# Altium schematic symbol library Minh_Lib.SchLib: 619 symbols (part 1 of 4) (continued)
## C1206C103J4RACTU
designator C?  Supplier Part Number 1: 80-C1206C103J4R
Capacitor, ceramic, 10Nf, 16Vdc, 5-% Tol, 5+% Tol, x7R-Tc Code, -15, 15%-Tc Rohs Compliant: Yes; Manufacturer: KEMET; Manufacturer Part Number: C1206C103J4RACTU; Tolerance: 5%; Dielectric: X7R; Voltage Rating (DC): 16V; Supplier 1: Mouser; RoHS: Yes; Category: Ceramic Capacitors; Stock 1: 1310; Pricing 1: 1=0.48000, 10=0.32300, 50=0.32300, 100=0.19400, 1000=0.13700, 10000=0.11000 (USD); Mount: Surface Mount; Case/Package: 1206; Dielectric Material: Ceramic; Case Code (Imperial): 1206; Case Code (Metric): 3216; Weight: 0.000571oz; Min Operating Temperature: -55°C; Max Operating Temperature: 125°C; Capacitance: 10nF; Packaging: Tape and Reel; Voltage Rating: 16V; Construction: Flat; Package Quantity: 4000; Termination: SMD/SMT; Series: C1206C; Length: 3.2mm; Width: 1.6mm; Height: 0.78mm; Depth: 1.6mm; Thickness: 0.035inch; RoHS Compliant: Yes; ComponentLink1URL: http://www.mouser.com/ds/2/212/KEM_C1002_X7R_SMD-1102033.pdf?src-supplier=Mouser; ComponentLink1Description: http://www.mouser.com/ds/2/212/KEM_C1002_X7R_SMD-1102033.pdf?src-supplier=Mouser; ComponentLink2URL: http://components.arrow.com/part/dataview/3455918S8615911N7429?src-supplier=Arrow+Electronics; ComponentLink2Description: http://components.arrow.com/part/dataview/3455918S8615911N7429?src-supplier=Arrow+Electronics; ComponentLink3URL: https://search.kemet.com/component-edge/download/datasheet/C1206C103J4RACTU.pdf?src-supplier=Digi-Key; ComponentLink3Description: https://search.kemet.com/component-edge/download/datasheet/C1206C103J4RACTU.pdf?src-supplier=Digi-Key
footprint CAP1206
pins: 1, 2

## C1206C103J5RACTU
designator C?  Supplier Part Number 1: 27X7669
1206 C 10nF Ceramic Multilayer Capacitor; 50 VDC; +125degC; X7R Dielec; +/-5%; Manufacturer: KEMET; Manufacturer Part Number: C1206C103J5RACTU; Tolerance: 5%; Voltage Rating (DC): 50V; Dissipation Factor: 2.5%; Supplier 1: Newark; RoHS: Yes; Category: Ceramic Capacitors; Stock 1: 8000; Pricing 1: 1=0.02100, 8000=0.02100, 16000=0.02100, 24000=0.02100 (USD); Mount: Surface Mount,PCB; Case/Package: 1206; Case Code (Imperial): 1206; Case Code (Metric): 3216; Dielectric Material: Ceramic; Contact Plating: Tin,Matte; Min Operating Temperature: -55°C; Max Operating Temperature: 125°C; Capacitance: 10nF; Packaging: Tape and Reel; Dielectric: X7R; Voltage Rating: 50V; Package Quantity: 1; Termination: SMD/SMT; Series: C; Construction: Flat; Voltage: 50V; Length: 3.2mm; Width: 1.6mm; Height: 0.78mm; Depth: 1.6mm; Thickness: 0.035inch; Radiation Hardening: No; RoHS Compliant: Yes; REACH SVHC: No SVHC; ComponentLink1URL: https://datasheet.ciiva.com/7730/kem-c1002-x7r-smd-7730069.pdf?src-supplier=Element14; ComponentLink1Description: https://datasheet.ciiva.com/7730/kem-c1002-x7r-smd-7730069.pdf?src-supplier=Element14; ComponentLink2URL: https://datasheet.ciiva.com/18194/getdatasheetpartid-385816-18194103.pdf?src-supplier=Verical; ComponentLink2Description: https://datasheet.ciiva.com/18194/getdatasheetpartid-385816-18194103.pdf?src-supplier=Verical; ComponentLink3URL: https://datasheet.ciiva.com/46392/1791936-46392364.pdf?src-supplier=Element14; ComponentLink3Description: https://datasheet.ciiva.com/46392/1791936-46392364.pdf?src-supplier=Element14
footprint CAP1206
pins: 1, 2

## C1206C103J8GACTU
designator C?  Supplier Part Number 1: 80-C1206C103J8G
Multilayer Ceramic Capacitors MLCC - SMD/SMT 10volts 10000pF C0G 5%; Manufacturer: KEMET; Manufacturer Part Number: C1206C103J8GACTU; Capacitance: 10nF; Voltage Rating: 10V; Dissipation Factor: 0.1%; Supplier 1: Mouser; RoHS: Yes; Category: Ceramic Capacitors; Case/Package: 1206; Case Code (Imperial): 1206; Case Code (Metric): 3216; Min Operating Temperature: -55°C; Max Operating Temperature: 125°C; Tolerance: 5%; Packaging: Tape and Reel; Package Quantity: 4000; Voltage Rating (DC): 10V; Dielectric: C0G; Termination: SMD/SMT; Series: C1206C; Length: 3.2mm; Width: 1.6mm; Height: 1mm; RoHS Compliant: Yes; ComponentLink1URL: https://datasheet.ciiva.com/13270/kem-c1003-c0g-smd-356956-13270396.pdf?src-supplier=Mouser; ComponentLink1Description: https://datasheet.ciiva.com/13270/kem-c1003-c0g-smd-356956-13270396.pdf?src-supplier=Mouser
footprint CAP1206
pins: 1, 2

## C1206C103K3HACTU
designator C?  Supplier Part Number 1: 80-C1206C103K3H
Cap Ceramic 0.01uF 25V X8R 10% SMD 1206 150Â°C T/R; Manufacturer: KEMET; Manufacturer Part Number: C1206C103K3HACTU; Capacitance: 10nF; Dissipation Factor: 2.5%; Supplier 1: Mouser; RoHS: Yes; Category: Ceramic Capacitors; Case/Package: 1206; Case Code (Imperial): 1206; Case Code (Metric): 3216; Min Operating Temperature: -55°C; Max Operating Temperature: 150°C; Tolerance: 10%; Dielectric: X8R; Packaging: Tape and Reel; Voltage Rating (DC): 25V; Voltage Rating: 25V; Package Quantity: 4000; Termination: SMD/SMT; Series: C1206C; Length: 3.2mm; Width: 1.6mm; Height: 0.78mm; RoHS Compliant: Yes; ComponentLink1URL: http://www.mouser.com/ds/2/212/KEM_C1007_X8R_ULTRA_150C_SMD-355490.pdf?src-supplier=Mouser; ComponentLink1Description: http://www.mouser.com/ds/2/212/KEM_C1007_X8R_ULTRA_150C_SMD-355490.pdf?src-supplier=Mouser
footprint CAP1206
pins: 1, 2

## C1206C103K4RACTU
designator C?  Supplier Part Number 1: 82AC2532
Cap Ceramic 0.01uF 16V X7R 10% SMD 1206 125°C Plastic T/R; Manufacturer: KEMET; Manufacturer Part Number: C1206C103K4RACTU; Capacitance: 10nF; Supplier 1: Newark; RoHS: Yes; Category: Ceramic Capacitors; Stock 1: 3050; Pricing 1: 10=0.29000, 25=0.24900, 50=0.20600, 100=0.16500 (USD); Mount: Surface Mount; Case/Package: 1206; Dielectric Material: Ceramic; Case Code (Imperial): 1206; Case Code (Metric): 3216; Weight: 0.000571oz; Min Operating Temperature: -55°C; Max Operating Temperature: 125°C; Tolerance: 10%; Voltage Rating (DC): 16V; Dielectric: X7R; Packaging: Tape and Reel; Voltage Rating: 16V; Package Quantity: 4000; Termination: SMD/SMT; Series: C; Construction: Flat; Length: 3.2mm; Width: 1.6mm; Height: 0.78mm; Depth: 1.6mm; Thickness: 0.035inch; RoHS Compliant: Yes; ComponentLink1URL: http://components.arrow.com/part/dataview/3455975S8615920N7429?src-supplier=Arrow+Electronics; ComponentLink1Description: http://components.arrow.com/part/dataview/3455975S8615920N7429?src-supplier=Arrow+Electronics; ComponentLink2URL: http://www.mouser.com/ds/2/212/KEM_C1002_X7R_SMD-1102033.pdf?src-supplier=Mouser; ComponentLink2Description: http://www.mouser.com/ds/2/212/KEM_C1002_X7R_SMD-1102033.pdf?src-supplier=Mouser; ComponentLink3URL: http://www.kemet.com/docfinder?Partnumber=C1206C103K4RACTU&src-supplier=Digi-Key; ComponentLink3Description: http://www.kemet.com/docfinder?Partnumber=C1206C103K4RACTU&src-supplier=Digi-Key
footprint CAP1206
pins: 1, 2

## C1206C103K5RAC
designator C?  Supplier Part Number 1: C1206C103K5RAC
Cap Ceramic 0.01uF 50V X7R 10% Pad SMD 1206 125C Bulk; Manufacturer: KEMET; Capacitance: 10nF; Dissipation Factor: 2.5%; Supplier 1: Arrow Electronics; Manufacturer Part Number: C1206C103K5RAC; RoHS: Yes; Category: Ceramic Capacitors; Stock 1: 28636; Pricing 1: 1=0.20000, 10=0.07820, 100=0.05390, 500=0.04460, 1000=0.03550, 4000=0.02750, 8000=0.02440, 24000=0.02230, 48000=0.01840 (USD); Mount: Surface Mount; Case/Package: 1206; Number of Pins: 2; Case Code (Imperial): 1206; Case Code (Metric): 3216; Dielectric Material: Ceramic; Material: Ceramic; Min Operating Temperature: -55°C; Max Operating Temperature: 125°C; Tolerance: 10%; Packaging: Tape and Reel; Package Quantity: 4000; Voltage Rating (DC): 50V; Dielectric: X7R; Termination: SMD/SMT; Series: C1206C; Voltage Rating: 50V; Voltage: 50V; Length: 3.2mm; Width: 1.6mm; Height: 0.78mm; Depth: 1.6mm; ComponentLink1URL: https://datasheet.ciiva.com/14116/slceramic-chip-condensers-e-14116570.pdf?src-supplier=Distrelec; ComponentLink1Description: https://datasheet.ciiva.com/14116/slceramic-chip-condensers-e-14116570.pdf?src-supplier=Distrelec; ComponentLink2URL: https://datasheet.ciiva.com/13389/kem-c1002-x7r-smd-357932-13389673.pdf?src-supplier=Mouser; ComponentLink2Description: https://datasheet.ciiva.com/13389/kem-c1002-x7r-smd-357932-13389673.pdf?src-supplier=Mouser; ComponentLink3URL: https://datasheet.ciiva.com/29242/458111-da-01-en-keramik-kondensator-c1206c103k5rac-29242412.pdf?src-supplier=Conrad; ComponentLink3Description: https://datasheet.ciiva.com/29242/458111-da-01-en-keramik-kondensator-c1206c103k5rac-29242412.pdf?src-supplier=Conrad
footprint CAP1206
pins: 1, 2

## C1206C103K8JACAUTO
designator C?  Supplier Part Number 1: 71111625
Cap Cer 10000PF 10V U2J 1206 10%; Manufacturer: KEMET; Manufacturer Part Number: C1206C103K8JACAUTO; Supplier 1: Allied Electronics; RoHS: Yes; Category: Ceramic Capacitors; Pricing 1: 4000=0.09300, 200000=0.09100 (USD); RoHS Compliant: Yes
footprint CAP1206
pins: 1, 2

## C1206C104J3GACTU
designator C?  Supplier Part Number 1: 8029970
1206 C 100nF Ceramic Multilayer Capacitor; 25 V; +125degC; C0G Dielectric; +/-5%; Manufacturer: KEMET; Manufacturer Part Number: C1206C104J3GACTU; Tolerance: 5%; Voltage Rating (DC): 25V; Dissipation Factor: 0.1%; Temperature Coefficient: 30ppm/°C; Supplier 1: RSComponents; RoHS: Yes; Category: Ceramic Capacitors; Stock 1: 155; Pricing 1: 5=1.92300, 250=0.92500, 1000=0.77200, 2000=0.52200 (USD); Mount: Surface Mount,PCB; Case/Package: 1206; Number of Pins: 2; Dielectric Material: Ceramic; Case Code (Metric): 3216; Case Code (Imperial): 1206; Contact Plating: Tin,Matte; Min Operating Temperature: -55°C; Max Operating Temperature: 125°C; Capacitance: 100nF; Dielectric: C0G; Packaging: Tape and Reel; Voltage Rating: 25V; Package Quantity: 2000; Series: -; Termination: SMD/SMT; Construction: Flat; Voltage: 25V; Length: 3.2mm; Width: 0.063inch; Height: 1.6mm; Depth: 1.6mm; Thickness: 0.071inch; Radiation Hardening: No; RoHS Compliant: Yes; Lead Free: Lead Free; REACH SVHC: No SVHC; ComponentLink1URL: https://datasheet.ciiva.com/7729/96329-7729797.pdf?src-supplier=Element14; ComponentLink1Description: https://datasheet.ciiva.com/7729/96329-7729797.pdf?src-supplier=Element14; ComponentLink2URL: https://datasheet.ciiva.com/5427/kem-c1003-c0g-smd-356956-5427960.pdf?src-supplier=Mouser; ComponentLink2Description: https://datasheet.ciiva.com/5427/kem-c1003-c0g-smd-356956-5427960.pdf?src-supplier=Mouser; ComponentLink3URL: https://datasheet.ciiva.com/6094/f9080b-0402-series-c0g-6094136.pdf?src-supplier=Farnell; ComponentLink3Description: https://datasheet.ciiva.com/6094/f9080b-0402-series-c0g-6094136.pdf?src-supplier=Farnell; ComponentLink4URL: https://datasheet.ciiva.com/28533/1372242-28533225.pdf?src-supplier=Element14; ComponentLink4Description: https://datasheet.ciiva.com/28533/1372242-28533225.pdf?src-supplier=Element14; ComponentLink5URL: https://datasheet.ciiva.com/7730/f9080b-0402-series-c0g-7730074.pdf?src-supplier=Element14; ComponentLink5Description: https://datasheet.ciiva.com/7730/f9080b-0402-series-c0g-7730074.pdf?src-supplier=Element14
footprint CAP1206
pins: 1, 2

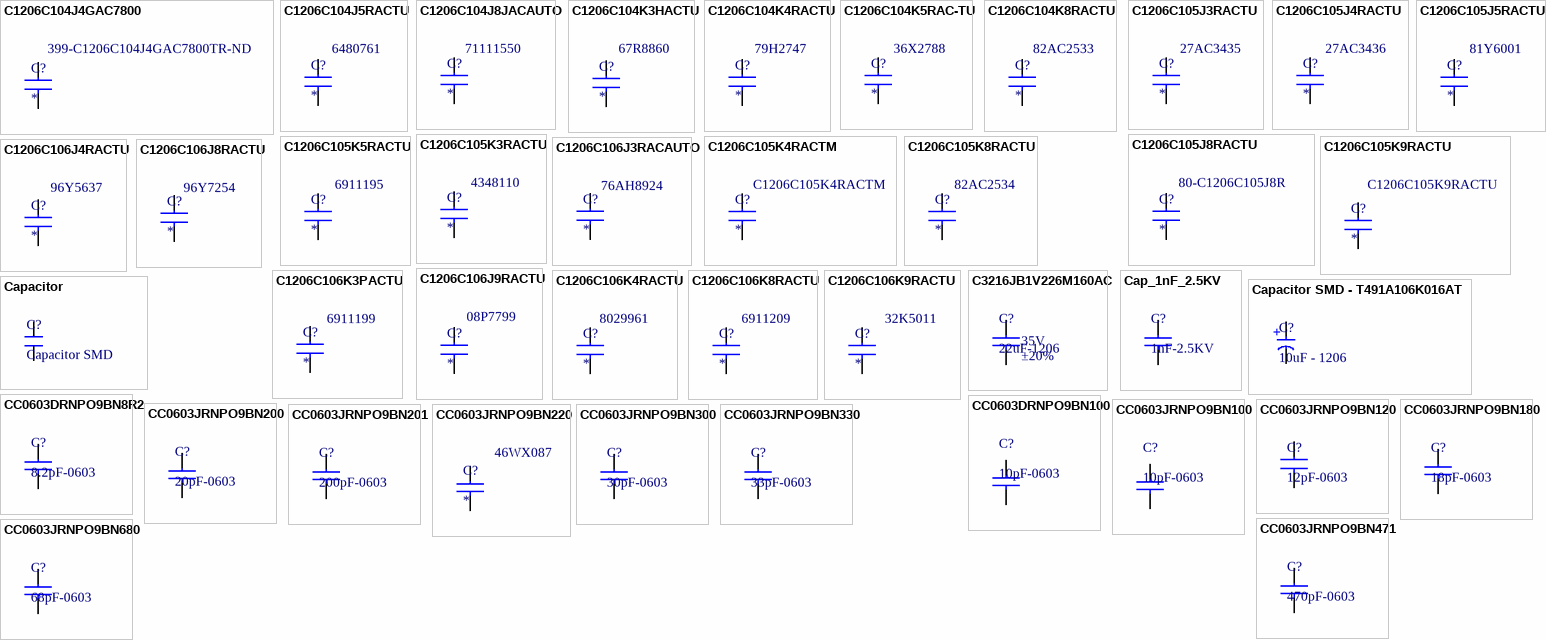
[diagram p3: symbols C1206C104J4GAC7800 to CC0603JRNPO9BN680]

## C1206C104J4GAC7800
designator C?  Supplier Part Number 1: 399-C1206C104J4GAC7800TR-ND
Cap Ceramic 0.1uF 16V C0G 5% SMD 1206 125C Plastic T/R; Manufacturer: KEMET; Manufacturer Part Number: C1206C104J4GAC7800; Capacitance: 100nF; Supplier 1: Digi-Key; RoHS: Yes; Category: Capacitors; Pricing 1: 2000=0.61215 (USD); Case/Package: 1206; Min Operating Temperature: -55°C; Max Operating Temperature: 125°C; Packaging: Tape and Reel; Tolerance: 5%; Dielectric: C0G; Length: 3.2mm; Depth: 1.6mm; RoHS Compliant: Yes; ComponentLink1URL: http://components.arrow.com/part/dataview/0323_00344682?src-supplier=Arrow+Europe; ComponentLink1Description: http://components.arrow.com/part/dataview/0323_00344682?src-supplier=Arrow+Europe
footprint CAP1206
pins: 1, 2

## C1206C104J5RACTU
designator C?  Supplier Part Number 1: 6480761
Cap Ceramic 0.1uF 50V X7R 5% SMD 1206 125°C Plastic T/R; Manufacturer: KEMET; Manufacturer Part Number: C1206C104J5RACTU; Capacitance: 100nF; Supplier 1: RSComponents; RoHS: Yes; Category: Ceramic Capacitors; Stock 1: 5350; Pricing 1: 10=0.26100, 100=0.24500, 250=0.23000, 500=0.21700, 1000=0.19600 (USD); Mount: Surface Mount,PCB; Case/Package: 1206; Number of Pins: 2; Dielectric Material: Ceramic; Case Code (Imperial): 1206; Case Code (Metric): 3216; Contact Plating: Tin,Matte; Min Operating Temperature: -55°C; Max Operating Temperature: 125°C; Tolerance: 5%; Dielectric: X7R; Packaging: Tape and Reel; Voltage Rating (DC): 50V; Voltage Rating: 50V; Termination: SMD/SMT; Package Quantity: 1; Voltage: 50V; Length: 3.2mm; Width: 1.6mm; Height: 0.78mm; Depth: 1.6mm; Thickness: 0.035inch; Radiation Hardening: No; REACH SVHC: No SVHC; ComponentLink1URL: https://datasheet.ciiva.com/6125/1732734-6125478.pdf?src-supplier=Farnell; ComponentLink1Description: https://datasheet.ciiva.com/6125/1732734-6125478.pdf?src-supplier=Farnell; ComponentLink2URL: https://datasheet.ciiva.com/14597/70095383-14597093.pdf?src-supplier=Allied+Electronics; ComponentLink2Description: https://datasheet.ciiva.com/14597/70095383-14597093.pdf?src-supplier=Allied+Electronics; ComponentLink3URL: https://datasheet.ciiva.com/18194/getdatasheetpartid-330950-18194135.pdf?src-supplier=Verical; ComponentLink3Description: https://datasheet.ciiva.com/18194/getdatasheetpartid-330950-18194135.pdf?src-supplier=Verical; ComponentLink4URL: https://datasheet.ciiva.com/22749/kem-c1002-x7r-smd-22749658.pdf?src-supplier=Element14; ComponentLink4Description: https://datasheet.ciiva.com/22749/kem-c1002-x7r-smd-22749658.pdf?src-supplier=Element14; ComponentLink5URL: https://datasheet.ciiva.com/7730/1851736-7730075.pdf?src-supplier=Element14; ComponentLink5Description: https://datasheet.ciiva.com/7730/1851736-7730075.pdf?src-supplier=Element14; ComponentLink6URL: https://datasheet.ciiva.com/14586/70095383-14586795.pdf?src-supplier=Allied+Electronics; ComponentLink6Description: https://datasheet.ciiva.com/14586/70095383-14586795.pdf?src-supplier=Allied+Electronics; ComponentLink7URL: https://datasheet.ciiva.com/28682/1851736-28682236.pdf?src-supplier=Element14; ComponentLink7Description: https://datasheet.ciiva.com/28682/1851736-28682236.pdf?src-supplier=Element14; ComponentLink8URL: https://datasheet.ciiva.com/22703/1851736-22703421.pdf?src-supplier=Element14; ComponentLink8Description: https://datasheet.ciiva.com/22703/1851736-22703421.pdf?src-supplier=Element14
footprint CAP1206
pins: 1, 2

## C1206C104J8JACAUTO
designator C?  Supplier Part Number 1: 71111550
Cap Cer 0.1UF 10V 10% X7R 1206 5%; Manufacturer: KEMET; Manufacturer Part Number: C1206C104J8JACAUTO; Capacitance: 100nF; Supplier 1: Allied Electronics; RoHS: Yes; Category: Ceramic Capacitors; Pricing 1: 4000=0.20600, 200000=0.20200 (USD); Mount: Surface Mount; Case/Package: 1206; Min Operating Temperature: -55°C; Max Operating Temperature: 125°C; Packaging: Tape and Reel; Tolerance: 5%; Voltage Rating: 10V; Ratings: AEC-Q200; RoHS Compliant: Yes; ComponentLink1URL: https://api.kemet.com/component-edge/download/datasheet/C1206C104J8JACAUTO.pdf?src-supplier=Digi-Key; ComponentLink1Description: https://api.kemet.com/component-edge/download/datasheet/C1206C104J8JACAUTO.pdf?src-supplier=Digi-Key
footprint CAP1206
pins: 1, 2

## C1206C104K3HACTU
designator C?  Supplier Part Number 1: 67R8860
Cap Ceramic 0.1uF 25V X8R 10% SMD 1206 150°C Plastic T/R; Manufacturer: KEMET; Manufacturer Part Number: C1206C104K3HACTU; Capacitance: 100nF; Dissipation Factor: 2.5%; Supplier 1: Newark; RoHS: Yes; Category: Ceramic Capacitors; Stock 1: 4048; Pricing 1: 5=0.61500, 10=0.58000, 25=0.54100, 50=0.50400, 100=0.46900 (USD); Mount: Surface Mount,PCB; Case/Package: 1206; Dielectric Material: Ceramic; Case Code (Imperial): 1206; Case Code (Metric): 3216; Min Operating Temperature: -55°C; Max Operating Temperature: 150°C; Tolerance: 10%; Dielectric: X8R; Packaging: Tape and Reel; Voltage Rating (DC): 25V; Voltage Rating: 25V; Package Quantity: 1; Termination: SMD/SMT; Series: C; Construction: Flat; Voltage: 25V; Features: High Temperature; Length: 3.2mm; Width: 1.6mm; Height: 1.6mm; Thickness: 0.071inch; Depth: 1.6mm; Radiation Hardening: No; RoHS Compliant: Yes; Lead Free: Lead Free; REACH SVHC: No SVHC; ComponentLink1URL: https://datasheet.ciiva.com/18194/getdatasheetpartid-556313-18194149.pdf?src-supplier=Verical; ComponentLink1Description: https://datasheet.ciiva.com/18194/getdatasheetpartid-556313-18194149.pdf?src-supplier=Verical; ComponentLink2URL: https://datasheet.ciiva.com/14588/70096614-14588888.pdf?src-supplier=Allied+Electronics; ComponentLink2Description: https://datasheet.ciiva.com/14588/70096614-14588888.pdf?src-supplier=Allied+Electronics; ComponentLink3URL: https://datasheet.ciiva.com/7729/524116-7729802.pdf?src-supplier=Element14; ComponentLink3Description: https://datasheet.ciiva.com/7729/524116-7729802.pdf?src-supplier=Element14
footprint CAP1206
pins: 1, 2

## C1206C104K4RACTU
designator C?  Supplier Part Number 1: 79H2747
Cap Ceramic 0.1uF 16V X7R 10% SMD 1206 125°C Plastic T/R; Manufacturer: KEMET; Manufacturer Part Number: C1206C104K4RACTU; Capacitance: 100nF; Dissipation Factor: 5%; Supplier 1: Newark; RoHS: Yes; Category: Ceramic Capacitors; Stock 1: 8000; Pricing 1: 4000=0.06000 (USD); Mount: Surface Mount; Case/Package: 1206; Case Code (Metric): 3216; Case Code (Imperial): 1206; Dielectric Material: Ceramic; Min Operating Temperature: -55°C; Max Operating Temperature: 125°C; Tolerance: 10%; Voltage Rating: 16V; Packaging: Tape and Reel; Dielectric: X7R; Package Quantity: 1; Voltage Rating (DC): 16V; Termination: SMD/SMT; Series: C; Construction: Flat; Length: 3.2mm; Width: 0.063inch; Height: 0.78mm; Thickness: 0.035inch; Depth: 1.6mm; Radiation Hardening: No; RoHS Compliant: Yes; REACH SVHC: No SVHC; ComponentLink1URL: http://components.arrow.com/part/dataview/0323_00341726?src-supplier=Arrow+Europe; ComponentLink1Description: http://components.arrow.com/part/dataview/0323_00341726?src-supplier=Arrow+Europe; ComponentLink2URL: http://www.farnell.com/datasheets/2745978.pdf?src-supplier=Farnell; ComponentLink2Description: http://www.farnell.com/datasheets/2745978.pdf?src-supplier=Farnell; ComponentLink3URL: http://www.mouser.com/ds/2/212/KEM_C1002_X7R_SMD-1102033.pdf?src-supplier=Mouser; ComponentLink3Description: http://www.mouser.com/ds/2/212/KEM_C1002_X7R_SMD-1102033.pdf?src-supplier=Mouser; ComponentLink4URL: http://components.arrow.com/part/dataview/3457897S5973821N7429?src-supplier=Arrow+Electronics; ComponentLink4Description: http://components.arrow.com/part/dataview/3457897S5973821N7429?src-supplier=Arrow+Electronics; ComponentLink5URL: http://www.farnell.com/datasheets/2112207.pdf?src-supplier=Element14; ComponentLink5Description: http://www.farnell.com/datasheets/2112207.pdf?src-supplier=Element14; ComponentLink6URL: http://www.farnell.com/datasheets/2745978.pdf?src-supplier=Newark; ComponentLink6Description: http://www.farnell.com/datasheets/2745978.pdf?src-supplier=Newark; ComponentLink7URL: https://api.kemet.com/component-edge/download/datasheet/C1206C104K4RACTU.pdf?src-supplier=Digi-Key; ComponentLink7Description: https://api.kemet.com/component-edge/download/datasheet/C1206C104K4RACTU.pdf?src-supplier=Digi-Key; ComponentLink8URL: https://search.kemet.com/component-edge/download/datasheet/C1206C104K4RACTU.pdf?src-supplier=Digi-Key; ComponentLink8Description: https://search.kemet.com/component-edge/download/datasheet/C1206C104K4RACTU.pdf?src-supplier=Digi-Key
footprint CAP1206
pins: 1, 2

## C1206C104K5RAC-TU
designator C?  Supplier Part Number 1: 36X2788
Ceramic Capacitor, Multilayer, Ceramic, 50V, 10% +Tol, 10% -Tol, X7R, 15% TC, 0.1uF, Surface Mount, 1206; Manufacturer: KEMET; Manufacturer Part Number: C1206C104K5RAC-TU; Capacitance: 100nF; Supplier 1: Newark; RoHS: Yes; Category: Ceramic Capacitors; Stock 1: 412000; Pricing 1: 1=0.17800, 4000=0.10600, 8000=0.03500, 16000=0.03100 (USD); Mount: Surface Mount; Case/Package: 1206; Number of Pins: 2; Dielectric Material: Ceramic; Case Code (Imperial): 1206; Case Code (Metric): 3216; Contact Plating: Tin,Matte; Min Operating Temperature: -55°C; Max Operating Temperature: 125°C; Packaging: Tape and Reel; Tolerance: 10%; Voltage Rating (DC): 50V; Dielectric: X7R; Voltage Rating: 50V; Package Quantity: 4000; Termination: SMD/SMT; Series: C1206C; Construction: Flat; Voltage: 50V; Length: 3.2mm; Width: 1.6mm; Height: 0.78mm; Depth: 1.6mm; Radiation Hardening: No; RoHS Compliant: Yes; REACH SVHC: No SVHC; ComponentLink1URL: https://datasheet.ciiva.com/6125/1725438-6125494.pdf?src-supplier=Farnell; ComponentLink1Description: https://datasheet.ciiva.com/6125/1725438-6125494.pdf?src-supplier=Farnell; ComponentLink2URL: https://datasheet.ciiva.com/7729/1851736-7729804.pdf?src-supplier=Element14; ComponentLink2Description: https://datasheet.ciiva.com/7729/1851736-7729804.pdf?src-supplier=Element14; ComponentLink3URL: https://datasheet.ciiva.com/7729/1851736-7729805.pdf?src-supplier=Element14; ComponentLink3Description: https://datasheet.ciiva.com/7729/1851736-7729805.pdf?src-supplier=Element14; ComponentLink4URL: https://datasheet.ciiva.com/6125/kem-c1002-x7r-smd-6125493.pdf?src-supplier=Farnell; ComponentLink4Description: https://datasheet.ciiva.com/6125/kem-c1002-x7r-smd-6125493.pdf?src-supplier=Farnell; ComponentLink5URL: https://datasheet.ciiva.com/7730/kem-c1002-x7r-smd-7730076.pdf?src-supplier=Element14; ComponentLink5Description: https://datasheet.ciiva.com/7730/kem-c1002-x7r-smd-7730076.pdf?src-supplier=Element14; ComponentLink6URL: https://datasheet.ciiva.com/32426/slceramic-chip-condensers-e-32426463.pdf?src-supplier=Distrelec; ComponentLink6Description: https://datasheet.ciiva.com/32426/slceramic-chip-condensers-e-32426463.pdf?src-supplier=Distrelec; ComponentLink7URL: https://datasheet.ciiva.com/28682/1851736-28682249.pdf?src-supplier=Element14; ComponentLink7Description: https://datasheet.ciiva.com/28682/1851736-28682249.pdf?src-supplier=Element14; ComponentLink8URL: https://datasheet.ciiva.com/14584/70095383-14584998.pdf?src-supplier=Allied+Electronics; ComponentLink8Description: https://datasheet.ciiva.com/14584/70095383-14584998.pdf?src-supplier=Allied+Electronics; ComponentLink9URL: https://datasheet.ciiva.com/14589/70095383-14589050.pdf?src-supplier=Allied+Electronics; ComponentLink9Description: https://datasheet.ciiva.com/14589/70095383-14589050.pdf?src-supplier=Allied+Electronics; ComponentLink10URL: https://datasheet.ciiva.com/5423/kem-c1002-x7r-smd-5423254.pdf?src-supplier=Mouser; ComponentLink10Description: https://datasheet.ciiva.com/5423/kem-c1002-x7r-smd-5423254.pdf?src-supplier=Mouser; ComponentLink11URL: https://datasheet.ciiva.com/6094/kem-c1002-x7r-smd-6094137.pdf?src-supplier=Farnell; ComponentLink11Description: https://datasheet.ciiva.com/6094/kem-c1002-x7r-smd-6094137.pdf?src-supplier=Farnell; ComponentLink12URL: https://datasheet.ciiva.com/7730/kem-c1002-x7r-smd-7730077.pdf?src-supplier=Element14; ComponentLink12Description: https://datasheet.ciiva.com/7730/kem-c1002-x7r-smd-7730077.pdf?src-supplier=Element14; ComponentLink13URL: https://datasheet.ciiva.com/39122/docfinderpartnumberc0402c102k5ractu-39122940.pdf?src-supplier=Onlinecomponents.com; ComponentLink13Description: https://datasheet.ciiva.com/39122/docfinderpartnumberc0402c102k5ractu-39122940.pdf?src-supplier=Onlinecomponents.com
footprint CAP1206
pins: 1, 2

## C1206C104K8RACTU
designator C?  Supplier Part Number 1: 82AC2533
Cap Cer 0.1UF 10V 10% X7R 1206; Manufacturer: KEMET; Manufacturer Part Number: C1206C104K8RACTU; Dielectric Material: Ceramic; Capacitance: 100nF; Supplier 1: Newark; RoHS: Yes; Category: Ceramic Capacitors; Stock 1: 3539; Pricing 1: 10=0.27100, 25=0.25800, 50=0.24500, 100=0.23100 (USD); Mount: Surface Mount; Case/Package: 1206; Min Operating Temperature: -55°C; Max Operating Temperature: 125°C; Voltage Rating: 10V; Tolerance: 10%; Packaging: Tape and Reel; Package Quantity: 4000; Voltage Rating (DC): 10V; Series: C; Length: 0.126inch; Width: 0.063inch; Thickness: 0.035inch; RoHS Compliant: Yes; ComponentLink1URL: http://components.arrow.com/part/dataview/3457883S8313533N7429?src-supplier=Arrow+Electronics; ComponentLink1Description: http://components.arrow.com/part/dataview/3457883S8313533N7429?src-supplier=Arrow+Electronics; ComponentLink2URL: http://www.kemet.com/docfinder?Partnumber=C1206C104K8RACTU&src-supplier=Digi-Key; ComponentLink2Description: http://www.kemet.com/docfinder?Partnumber=C1206C104K8RACTU&src-supplier=Digi-Key
footprint CAP1206
pins: 1, 2

## C1206C105J3RACTU
designator C?  Supplier Part Number 1: 27AC3435
Cap Ceramic 1uF 25V X7R 5% SMD 1206 125°C Plastic T/R; Manufacturer: KEMET; Manufacturer Part Number: C1206C105J3RACTU; Supplier 1: Newark; RoHS: Yes; Category: Ceramic Capacitors; Stock 1: 446; Pricing 1: 5=1.28000, 10=0.90300, 25=0.79600, 50=0.68800, 100=0.58100 (USD); Mount: Surface Mount; Case/Package: 1206; Dielectric Material: Ceramic; Case Code (Metric): 3216; Case Code (Imperial): 1206; Min Operating Temperature: -55°C; Max Operating Temperature: 125°C; Dielectric: X7R; Capacitance: 1uF; Tolerance: 5%; Voltage Rating (DC): 25V; Voltage Rating: 25V; Package Quantity: 1; Packaging: Tape and Reel; Termination: SMD/SMT; Series: C; Construction: Flat; Length: 3.2mm; Width: 0.063inch; Height: 1.6mm; Depth: 1.6mm; Thickness: 0.055inch; Radiation Hardening: No; RoHS Compliant: Yes; REACH SVHC: No SVHC; ComponentLink1URL: http://www.farnell.com/datasheets/2123538.pdf?src-supplier=Farnell; ComponentLink1Description: http://www.farnell.com/datasheets/2123538.pdf?src-supplier=Farnell; ComponentLink2URL: http://components.arrow.com/part/dataview/0323_00341502?src-supplier=Arrow+Europe; ComponentLink2Description: http://components.arrow.com/part/dataview/0323_00341502?src-supplier=Arrow+Europe; ComponentLink3URL: http://www.mouser.com/ds/2/212/KEM_C1002_X7R_SMD-1102033.pdf?src-supplier=Mouser; ComponentLink3Description: http://www.mouser.com/ds/2/212/KEM_C1002_X7R_SMD-1102033.pdf?src-supplier=Mouser; ComponentLink4URL: https://search.kemet.com/component-edge/download/datasheet/C1206C105J3RACTU.pdf?src-supplier=Digi-Key; ComponentLink4Description: https://search.kemet.com/component-edge/download/datasheet/C1206C105J3RACTU.pdf?src-supplier=Digi-Key; ComponentLink5URL: http://www.farnell.com/datasheets/1918693.pdf?src-supplier=Element14; ComponentLink5Description: http://www.farnell.com/datasheets/1918693.pdf?src-supplier=Element14; ComponentLink6URL: https://api.kemet.com/component-edge/download/datasheet/C1206C105J3RACTU.pdf?src-supplier=Digi-Key; ComponentLink6Description: https://api.kemet.com/component-edge/download/datasheet/C1206C105J3RACTU.pdf?src-supplier=Digi-Key; ComponentLink7URL: https://www.verical.com/server-webapp/html/getDatasheet?partID=96881&src-supplier=Verical; ComponentLink7Description: https://www.verical.com/server-webapp/html/getDatasheet?partID=96881&src-supplier=Verical; ComponentLink8URL: http://www.kemet.com/Lists/ProductCatalog/Attachments/53/KEM_C1002_X7R_SMD.pdf?src-supplier=Avnet; ComponentLink8Description: http://www.kemet.com/Lists/ProductCatalog/Attachments/53/KEM_C1002_X7R_SMD.pdf?src-supplier=Avnet; ComponentLink9URL: http://www.farnell.com/datasheets/2123538.pdf?src-supplier=Element14; ComponentLink9Description: http://www.farnell.com/datasheets/2123538.pdf?src-supplier=Element14; ComponentLink10URL: http://components.arrow.com/part/dataview/2628228S5702948N7429?src-supplier=Arrow+Electronics; ComponentLink10Description: http://components.arrow.com/part/dataview/2628228S5702948N7429?src-supplier=Arrow+Electronics
footprint CAP1206
pins: 1, 2

## C1206C105J4RACTU
designator C?  Supplier Part Number 1: 27AC3436
Cap Ceramic 1uF 16V X7R 5% SMD 1206 125°C Plastic T/R; Manufacturer: KEMET; Manufacturer Part Number: C1206C105J4RACTU; Supplier 1: Newark; RoHS: Yes; Category: Ceramic Capacitors; Stock 1: 16978; Pricing 1: 1=1.36000, 5=1.36000, 10=0.96400, 25=0.84500, 50=0.72800, 100=0.60900 (USD); Mount: Surface Mount; Case/Package: 1206; Dielectric Material: Ceramic; Case Code (Metric): 3216; Case Code (Imperial): 1206; Min Operating Temperature: -55°C; Max Operating Temperature: 125°C; Capacitance: 1uF; Tolerance: 5%; Voltage Rating: 16V; Packaging: Tape and Reel; Dielectric: X7R; Package Quantity: 2500; Voltage Rating (DC): 16V; Series: C; Termination: SMD/SMT; Construction: Flat; Length: 3.2mm; Width: 0.063inch; Height: 1.2mm; Depth: 1.6mm; Thickness: 0.055inch; Radiation Hardening: No; RoHS Compliant: Yes; REACH SVHC: No SVHC; ComponentLink1URL: http://www.mouser.com/ds/2/212/KEM_C1002_X7R_SMD-1102033.pdf?src-supplier=Mouser; ComponentLink1Description: http://www.mouser.com/ds/2/212/KEM_C1002_X7R_SMD-1102033.pdf?src-supplier=Mouser; ComponentLink2URL: http://components.arrow.com/part/dataview/0323_00068368?src-supplier=Arrow+Europe; ComponentLink2Description: http://components.arrow.com/part/dataview/0323_00068368?src-supplier=Arrow+Europe; ComponentLink3URL: http://components.arrow.com/part/dataview/2096568S5801933N7429?src-supplier=Arrow+Electronics; ComponentLink3Description: http://components.arrow.com/part/dataview/2096568S5801933N7429?src-supplier=Arrow+Electronics; ComponentLink4URL: https://api.kemet.com/component-edge/download/datasheet/C1206C105J4RACTU.pdf?src-supplier=Digi-Key; ComponentLink4Description: https://api.kemet.com/component-edge/download/datasheet/C1206C105J4RACTU.pdf?src-supplier=Digi-Key; ComponentLink5URL: https://search.kemet.com/component-edge/download/datasheet/C1206C105J4RACTU.pdf?src-supplier=Digi-Key; ComponentLink5Description: https://search.kemet.com/component-edge/download/datasheet/C1206C105J4RACTU.pdf?src-supplier=Digi-Key; ComponentLink6URL: http://www.kemet.com/kemet/web/homepage/kechome.nsf/weben/C4DA2DA1D1C9D3C3CA2570A50016092D/$file/KEM_C1002_X7R_SMD.pdf?src-supplier=Avnet+Europe; ComponentLink6Description: http://www.kemet.com/kemet/web/homepage/kechome.nsf/weben/C4DA2DA1D1C9D3C3CA2570A50016092D/$file/KEM_C1002_X7R_SMD.pdf?src-supplier=Avnet+Europe
footprint CAP1206
pins: 1, 2

## C1206C105J5RACTU
designator C?  Supplier Part Number 1: 81Y6001
KEMET - C1206C105J5RACTU - CAP, 1µF, 50V, 5%, X7R, 1206; Dielectric Material: Ceramic; Capacitance: 1uF; Supplier 1: Newark; Manufacturer: KEMET; Manufacturer Part Number: C1206C105J5RACTU; RoHS: Yes; Category: Ceramic Capacitors; Stock 1: 15727; Pricing 1: 5=1.00000, 10=0.72500, 25=0.64300, 50=0.56000, 100=0.47800 (USD); Mount: Surface Mount; Case/Package: 1206; Case Code (Metric): 3216; Case Code (Imperial): 1206; Min Operating Temperature: -55°C; Max Operating Temperature: 125°C; Tolerance: 5%; Packaging: Tape and Reel; Voltage Rating: 50V; Dielectric: X7R; Voltage Rating (DC): 50V; Series: C; Construction: Flat; Length: 3.2mm; Width: 0.063inch; Height: 1mm; Depth: 1.6mm; Thickness: 0.043inch; Radiation Hardening: No; RoHS Compliant: Yes; REACH SVHC: No SVHC; ComponentLink1URL: http://components.arrow.com/part/dataview/0323_00625171?src-supplier=Arrow+Europe; ComponentLink1Description: http://components.arrow.com/part/dataview/0323_00625171?src-supplier=Arrow+Europe; ComponentLink2URL: http://www.farnell.com/datasheets/2746146.pdf?src-supplier=Farnell; ComponentLink2Description: http://www.farnell.com/datasheets/2746146.pdf?src-supplier=Farnell; ComponentLink3URL: http://components.arrow.com/part/dataview/48907691S8836792N7429?src-supplier=Arrow+Electronics; ComponentLink3Description: http://components.arrow.com/part/dataview/48907691S8836792N7429?src-supplier=Arrow+Electronics; ComponentLink4URL: http://www.kemet.com/docfinder?Partnumber=C1206C105J5RAC7800&src-supplier=Digi-Key; ComponentLink4Description: http://www.kemet.com/docfinder?Partnumber=C1206C105J5RAC7800&src-supplier=Digi-Key; ComponentLink5URL: https://api.kemet.com/component-edge/download/datasheet/C1206C105J5RAC7800.pdf?src-supplier=Digi-Key; ComponentLink5Description: https://api.kemet.com/component-edge/download/datasheet/C1206C105J5RAC7800.pdf?src-supplier=Digi-Key; ComponentLink6URL: http://www.kemet.com/kemet/web/homepage/kechome.nsf/weben/C4DA2DA1D1C9D3C3CA2570A50016092D/$file/KEM_C1002_X7R_SMD.pdf?src-supplier=Avnet; ComponentLink6Description: http://www.kemet.com/kemet/web/homepage/kechome.nsf/weben/C4DA2DA1D1C9D3C3CA2570A50016092D/$file/KEM_C1002_X7R_SMD.pdf?src-supplier=Avnet; ComponentLink7URL: http://www.farnell.com/datasheets/2746146.pdf?src-supplier=Newark; ComponentLink7Description: http://www.farnell.com/datasheets/2746146.pdf?src-supplier=Newark; ComponentLink8URL: http://www.farnell.com/datasheets/2032734.pdf?src-supplier=Element14; ComponentLink8Description: http://www.farnell.com/datasheets/2032734.pdf?src-supplier=Element14
footprint CAP1206
pins: 1, 2

## C1206C105J8RACTU
designator C?  Supplier Part Number 1: 80-C1206C105J8R
Capacitor, ceramic, 1Uf, 10Vdc, 5-% Tol, 5+% Tol, x7R-Tc Code, -15, 15%-Tc Rohs Compliant: Yes; Manufacturer: KEMET; Manufacturer Part Number: C1206C105J8RACTU; Tolerance: 5%; Dielectric: X7R; Voltage Rating (DC): 10V; Supplier 1: Mouser; RoHS: Yes; Category: Ceramic Capacitors; Stock 1: 2014; Pricing 1: 1=1.09000, 10=0.77100, 50=0.77100, 100=0.49800, 1000=0.39900, 10000=0.31100 (USD); Mount: Surface Mount; Case/Package: 1206; Dielectric Material: Ceramic; Case Code (Metric): 3216; Case Code (Imperial): 1206; Min Operating Temperature: -55°C; Max Operating Temperature: 125°C; Capacitance: 1uF; Package Quantity: 2500; Voltage Rating: 10V; Packaging: Tape and Reel; Termination: SMD/SMT; Series: C1206C; Length: 0.126inch; Width: 0.063inch; Height: 1.2mm; Depth: 1.6mm; Thickness: 0.053inch; RoHS Compliant: Yes; ComponentLink1URL: http://www.mouser.com/ds/2/212/KEM_C1002_X7R_SMD-1102033.pdf?src-supplier=Mouser; ComponentLink1Description: http://www.mouser.com/ds/2/212/KEM_C1002_X7R_SMD-1102033.pdf?src-supplier=Mouser; ComponentLink2URL: http://components.arrow.com/part/dataview/2628229S8615980N7429?src-supplier=Arrow+Electronics; ComponentLink2Description: http://components.arrow.com/part/dataview/2628229S8615980N7429?src-supplier=Arrow+Electronics; ComponentLink3URL: https://search.kemet.com/component-edge/download/datasheet/C1206C105J8RACTU.pdf?src-supplier=Digi-Key; ComponentLink3Description: https://search.kemet.com/component-edge/download/datasheet/C1206C105J8RACTU.pdf?src-supplier=Digi-Key
footprint CAP1206
pins: 1, 2

## C1206C105K3RACTU
designator C?  Supplier Part Number 1: 4348110
Ceramic Capacitor, Multilayer, Ceramic, 25V, 10% +Tol, 10% -Tol, X7R, 15% TC, 1uF, Surface Mount, 1206; Manufacturer: KEMET; Manufacturer Part Number: C1206C105K3RACTU; Supplier 1: RSComponents; RoHS: Yes; Category: Ceramic Capacitors; Stock 1: 7250; Pricing 1: 25=0.23100, 250=0.21700, 500=0.20300, 1000=0.19100, 2500=0.17300 (USD); Mount: Surface Mount; Case/Package: 1206; Dielectric Material: Ceramic; Case Code (Imperial): 1206; Case Code (Metric): 3216; Contact Plating: Tin,Matte; Min Operating Temperature: -55°C; Max Operating Temperature: 125°C; Voltage Rating (DC): 25V; Tolerance: 10%; Dielectric: X7R; Capacitance: 1uF; Packaging: Tape and Reel; Termination: SMD/SMT; Construction: Flat; Voltage Rating: 25V; Package Quantity: 2500; Series: C; Voltage: 25V; Length: 3.2mm; Width: 0.063inch; Height: 1.6mm; Depth: 1.6mm; Thickness: 0.055inch; Radiation Hardening: No; RoHS Compliant: Yes; REACH SVHC: No SVHC; ComponentLink1URL: https://datasheet.ciiva.com/18194/getdatasheetpartid-305165-18194171.pdf?src-supplier=Verical; ComponentLink1Description: https://datasheet.ciiva.com/18194/getdatasheetpartid-305165-18194171.pdf?src-supplier=Verical; ComponentLink2URL: https://datasheet.ciiva.com/22749/1918693-22749724.pdf?src-supplier=Element14; ComponentLink2Description: https://datasheet.ciiva.com/22749/1918693-22749724.pdf?src-supplier=Element14; ComponentLink3URL: https://datasheet.ciiva.com/20173/71-0501-20173277.pdf?src-supplier=Rapid+Electronics; ComponentLink3Description: https://datasheet.ciiva.com/20173/71-0501-20173277.pdf?src-supplier=Rapid+Electronics; ComponentLink4URL: https://datasheet.ciiva.com/39122/docfinderpartnumberc0402c102k5ractu-39122941.pdf?src-supplier=Onlinecomponents.com; ComponentLink4Description: https://datasheet.ciiva.com/39122/docfinderpartnumberc0402c102k5ractu-39122941.pdf?src-supplier=Onlinecomponents.com; ComponentLink5URL: https://datasheet.ciiva.com/45846/docfinderpartnumberc0402c102k5ractu-45846941.pdf?src-supplier=Onlinecomponents.com; ComponentLink5Description: https://datasheet.ciiva.com/45846/docfinderpartnumberc0402c102k5ractu-45846941.pdf?src-supplier=Onlinecomponents.com
footprint CAP1206
pins: 1, 2

## C1206C105K4RACTM
designator C?  Supplier Part Number 1: C1206C105K4RACTM
Cap Ceramic 1uF 16V X7R 10% SMD 1206 125°C Plastic T/R; Manufacturer: KEMET; Dissipation Factor: 5%; Supplier 1: Avnet; Manufacturer Part Number: C1206C105K4RACTM; RoHS: Yes; Category: Ceramic Capacitors; Stock 1: 12500; Pricing 1: 2500=0.02639, 5000=0.02594, 10000=0.02548, 15000=0.02503, 20000=0.02457, 25000=0.02412, 250000=0.02366 (USD); Mount: Surface Mount; Case/Package: 1206; Dielectric Material: Ceramic; Case Code (Metric): 3216; Case Code (Imperial): 1206; Min Operating Temperature: -55°C; Max Operating Temperature: 125°C; Capacitance: 1uF; Tolerance: 10%; Packaging: Tape and Reel; Dielectric: X7R; Voltage Rating (DC): 16V; Voltage Rating: 16V; Termination: SMD/SMT; Construction: Flat; Package Quantity: 2500; Series: C; Length: 3.2mm; Width: 0.063inch; Height: 1.2mm; Depth: 1.6mm; Thickness: 0.055inch; RoHS Compliant: Yes; ComponentLink1URL: http://www.mouser.com/ds/2/212/KEM_C1002_X7R_SMD-1102033.pdf?src-supplier=Mouser; ComponentLink1Description: http://www.mouser.com/ds/2/212/KEM_C1002_X7R_SMD-1102033.pdf?src-supplier=Mouser; ComponentLink2URL: https://api.kemet.com/component-edge/download/datasheet/C1206C105K4RACTM.pdf?src-supplier=Digi-Key; ComponentLink2Description: https://api.kemet.com/component-edge/download/datasheet/C1206C105K4RACTM.pdf?src-supplier=Digi-Key
footprint CAP1206
pins: 1, 2

## C1206C105K5RACTU
designator C?  Supplier Part Number 1: 6911195
SMD Multilayer Ceramic Capacitor, 1 µF, 50 V, 1206 [3216 Metric], ± 10%, X7R, C Series; Manufacturer: KEMET; Manufacturer Part Number: C1206C105K5RACTU; Capacitance: 1uF; Voltage Rating (DC): 50V; Supplier 1: RSComponents; RoHS: Yes; Category: Ceramic Capacitors; Stock 1: 2200; Pricing 1: 25=0.95500, 250=0.89700, 500=0.83900, 1000=0.79200, 2500=0.71500 (USD); Mount: Surface Mount; Case/Package: 1206; Number of Pins: 2; Dielectric Material: Ceramic; Case Code (Imperial): 1206; Case Code (Metric): 3216; Min Operating Temperature: -55°C; Max Operating Temperature: 125°C; Tolerance: 10%; Dielectric: X7R; Packaging: Tape and Reel; Voltage Rating: 50V; Termination: SMD/SMT; Package Quantity: 1; Series: C; Construction: Flat; Voltage: 50V; Length: 3.2mm; Width: 0.063inch; Height: 1mm; Depth: 1.6mm; Thickness: 0.043inch; Radiation Hardening: No; RoHS Compliant: Yes; REACH SVHC: No SVHC; ComponentLink1URL: https://datasheet.ciiva.com/7730/kem-c1002-x7r-smd-7730086.pdf?src-supplier=Element14; ComponentLink1Description: https://datasheet.ciiva.com/7730/kem-c1002-x7r-smd-7730086.pdf?src-supplier=Element14; ComponentLink2URL: https://datasheet.ciiva.com/6074/kem-c1002-x7r-smd-6074697.pdf?src-supplier=Farnell; ComponentLink2Description: https://datasheet.ciiva.com/6074/kem-c1002-x7r-smd-6074697.pdf?src-supplier=Farnell; ComponentLink3URL: https://datasheet.ciiva.com/22749/1918693-22749725.pdf?src-supplier=Element14; ComponentLink3Description: https://datasheet.ciiva.com/22749/1918693-22749725.pdf?src-supplier=Element14
footprint CAP1206
pins: 1, 2

## C1206C105K8RACTU
designator C?  Supplier Part Number 1: 82AC2534
Cap Ceramic 1uF 10V X7R 10% SMD 1206 125°C Plastic T/R; Manufacturer: KEMET; Manufacturer Part Number: C1206C105K8RACTU; Supplier 1: Newark; RoHS: Yes; Category: Ceramic Capacitors; Stock 1: 400; Pricing 1: 5=0.82000, 10=0.48300, 25=0.46000, 50=0.43700, 100=0.41400 (USD); Mount: Surface Mount; Case/Package: 1206; Dielectric Material: Ceramic; Case Code (Metric): 3216; Case Code (Imperial): 1206; Min Operating Temperature: -55°C; Max Operating Temperature: 125°C; Capacitance: 1uF; Tolerance: 10%; Dielectric: X7R; Voltage Rating (DC): 10V; Voltage Rating: 10V; Packaging: Tape and Reel; Series: C; Package Quantity: 2500; Termination: SMD/SMT; Length: 0.126inch; Width: 0.063inch; Height: 1.2mm; Depth: 1.6mm; Thickness: 0.055inch; RoHS Compliant: Yes; ComponentLink1URL: http://www.mouser.com/ds/2/212/KEM_C1002_X7R_SMD-1102033.pdf?src-supplier=Mouser; ComponentLink1Description: http://www.mouser.com/ds/2/212/KEM_C1002_X7R_SMD-1102033.pdf?src-supplier=Mouser; ComponentLink2URL: http://components.arrow.com/part/dataview/2628232S8615994N7429?src-supplier=Arrow+Electronics; ComponentLink2Description: http://components.arrow.com/part/dataview/2628232S8615994N7429?src-supplier=Arrow+Electronics; ComponentLink3URL: http://www.kemet.com/docfinder?Partnumber=C1206C105K8RACTU&src-supplier=Digi-Key; ComponentLink3Description: http://www.kemet.com/docfinder?Partnumber=C1206C105K8RACTU&src-supplier=Digi-Key
footprint CAP1206
pins: 1, 2

## C1206C105K9RACTU
designator C?  Supplier Part Number 1: C1206C105K9RACTU
Capacitor, ceramic, 1Uf, 6.3Vdc, 10-% Tol, 10+% Tol, x7R-Tc Code, -15, 15%-Tc Rohs Compliant: Yes; Manufacturer: KEMET; Tolerance: 10%; Dielectric: X7R; Voltage Rating (DC): 6.3V; Supplier 1: Arrow Electronics; Manufacturer Part Number: C1206C105K9RACTU; RoHS: Yes; Category: Ceramic Capacitors; Stock 1: 1150; Pricing 1: 1=0.25760, 10=0.23720, 25=0.23670, 100=0.22250, 250=0.22190, 500=0.20890, 1000=0.19740 (USD); Mount: Surface Mount; Case/Package: 1206; Dielectric Material: Ceramic; Case Code (Imperial): 1206; Case Code (Metric): 3216; Min Operating Temperature: -55°C; Max Operating Temperature: 125°C; Capacitance: 1uF; Packaging: Tape and Reel; Construction: Flat; Package Quantity: 2500; Voltage Rating: 6.3V; Termination: SMD/SMT; Series: C; Length: 3.2mm; Width: 1.6mm; Height: 1.2mm; Depth: 1.6mm; Thickness: 0.055inch; RoHS Compliant: Yes; ComponentLink1URL: https://datasheet.ciiva.com/5418/kem-c1002-x7r-smd-357932-5418341.pdf?src-supplier=Mouser; ComponentLink1Description: https://datasheet.ciiva.com/5418/kem-c1002-x7r-smd-357932-5418341.pdf?src-supplier=Mouser
footprint CAP1206
pins: 1, 2

## C1206C106J3RACAUTO
designator C?  Supplier Part Number 1: 76AH8924
Cap Ceramic 10uF 25V X7R 5% Pad SMD 1206 125C Automotive T/R; Manufacturer: KEMET; Manufacturer Part Number: C1206C106J3RACAUTO; Supplier 1: Newark; RoHS: Yes; Category: Ceramic Capacitors; Pricing 1: 1=1.19000, 10=0.81100, 25=0.74300, 50=0.67300, 100=0.60400 (USD); Mount: Surface Mount; Case/Package: 1206; Case Code (Imperial): 1206; Case Code (Metric): 3216; Min Operating Temperature: -55°C; Max Operating Temperature: 125°C; Packaging: Tape and Reel; Capacitance: 10uF; Tolerance: 5%; Voltage Rating: 25V; Ratings: AEC-Q200; RoHS Compliant: Yes; ComponentLink1URL: http://www.farnell.com/datasheets/2741396.pdf?src-supplier=Farnell; ComponentLink1Description: http://www.farnell.com/datasheets/2741396.pdf?src-supplier=Farnell; ComponentLink2URL: https://api.kemet.com/component-edge/download/datasheet/C1206C106J3RACAUTO.pdf?src-supplier=Digi-Key; ComponentLink2Description: https://api.kemet.com/component-edge/download/datasheet/C1206C106J3RACAUTO.pdf?src-supplier=Digi-Key; ComponentLink3URL: http://www.farnell.com/datasheets/2741396.pdf?src-supplier=Element14; ComponentLink3Description: http://www.farnell.com/datasheets/2741396.pdf?src-supplier=Element14; ComponentLink4URL: http://www.farnell.com/datasheets/2741396.pdf?src-supplier=Newark; ComponentLink4Description: http://www.farnell.com/datasheets/2741396.pdf?src-supplier=Newark
footprint CAP1206
pins: 1, 2
